# Altium footprint library 排针排座.PcbLib: 344 footprints (part 2 of 22)
Each footprint in its own frame and in the unit in brackets; x right, y up, seen from the top. Pads: shape width x height; smd on the part's side, far side on the other; paste and mask are expansions set on the pad; w line width, h text height; cw(c..) or ccw(c..) is an arc to the next point about the centre after c.
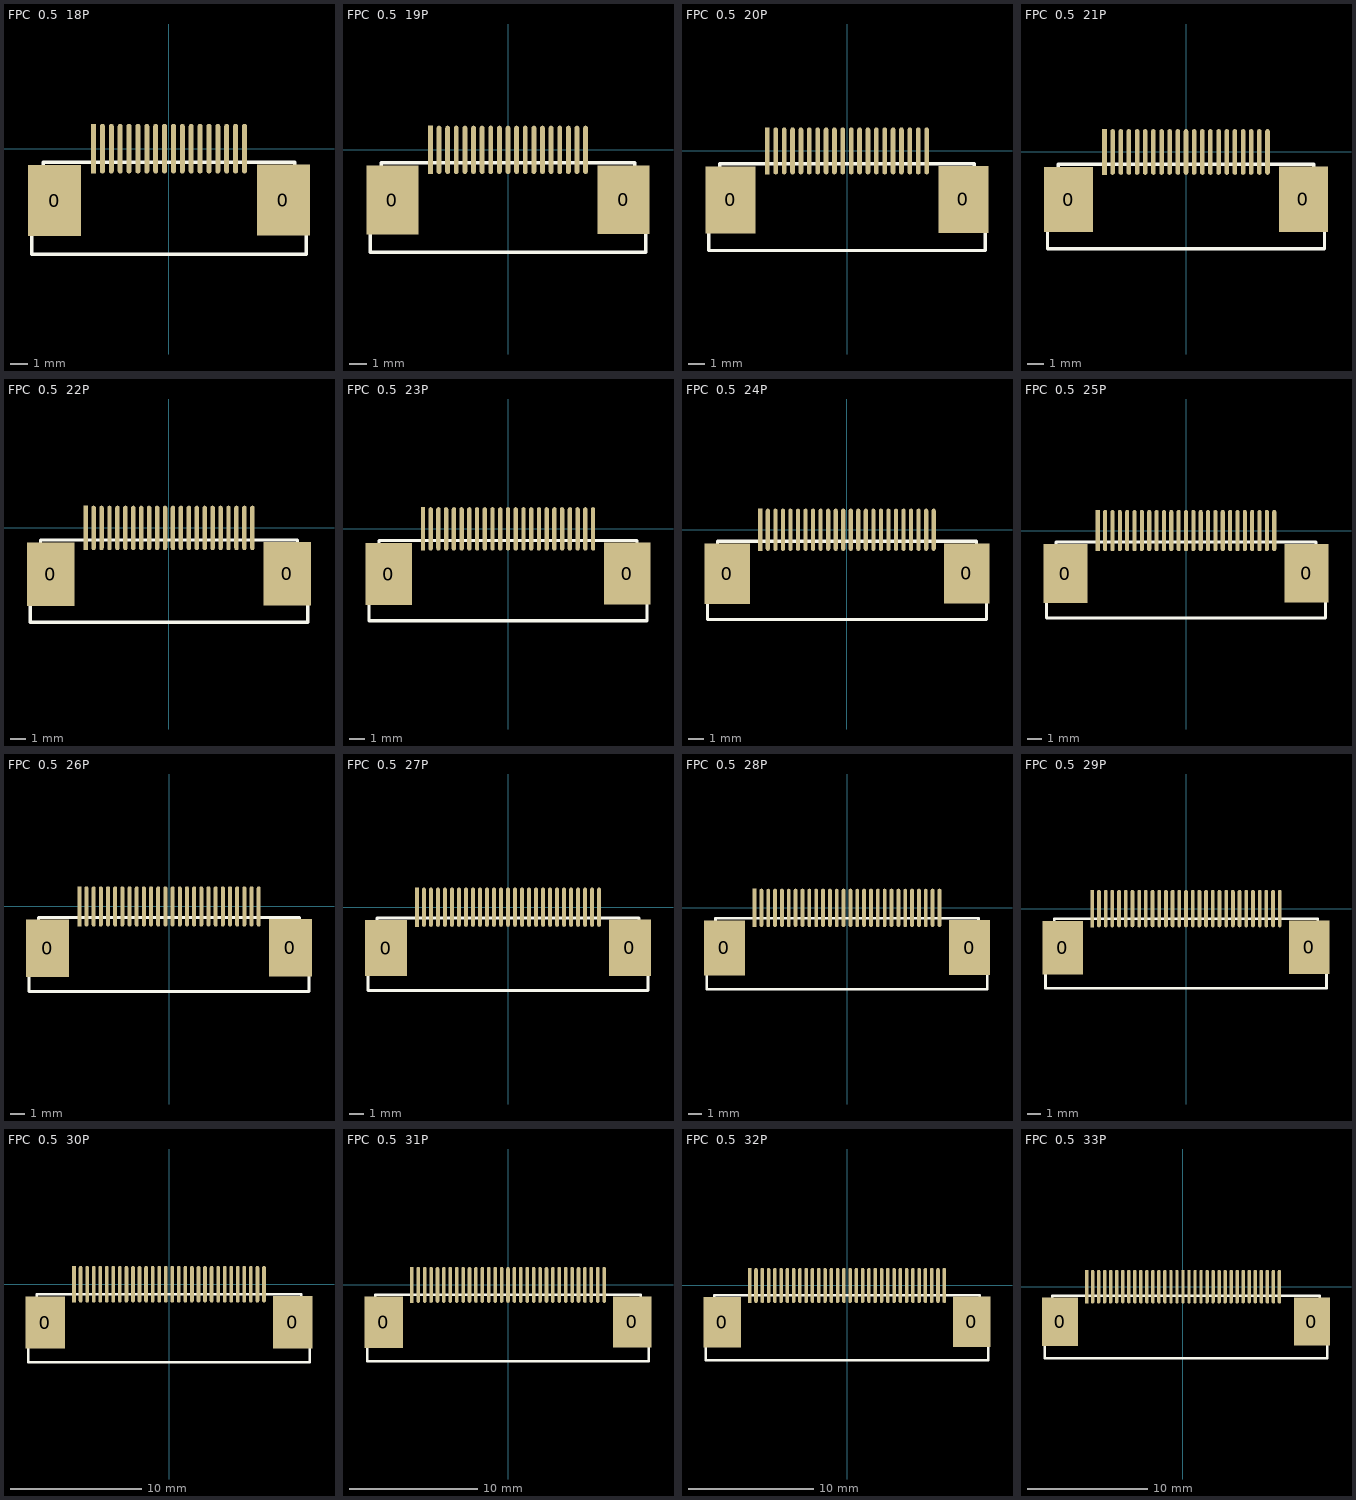
[diagram p1: the footprints below, top view; thin cyan lines are the x and y axes]

## FPC  0.5  18P [mm]
height 2
pads (20):
  rect 3x4 smd: 0(-6.446,-2.921) 0(6.454,-2.896)
  rect 0.28x2.8 smd: 1(-4.246,0)
  oval 0.28x2.8 smd: 2(-3.746,0) 3(-3.246,0) 4(-2.746,0) 5(-2.246,0) 6(-1.746,0) 7(-1.246,0) 8(-0.746,0) 9(-0.246,0) 10(0.254,0) 11(0.754,0) 12(1.254,0) 13(1.754,0) 14(2.254,0) 15(2.754,0) 16(3.254,0) 17(3.754,0) 18(4.254,0)
Top Overlay:
  lines w0.203: -7.738,-5.944 -7.738,-4.624 -7.14,-4.624 -7.088,-4.572 -7.088,-0.762 7.096,-0.762 7.096,-4.572 7.148,-4.624 7.746,-4.624 7.746,-5.944 -7.738,-5.944
3D body "FPC  0.5  18P.step": height 2, standoff 0, extent -7.65,-6 7.65,0

## FPC  0.5  19P [mm]
height 2
pads (21):
  rect 3x4 smd: 0(-6.7,-2.921) 0(6.7,-2.896)
  rect 0.28x2.8 smd: 1(-4.5,0)
  oval 0.28x2.8 smd: 2(-4,0) 3(-3.5,0) 4(-3,0) 5(-2.5,0) 6(-2,0) 7(-1.5,0) 8(-1,0) 9(-0.5,0) 10(0,0) 11(0.5,0) 12(1,0) 13(1.5,0) 14(2,0) 15(2.5,0) 16(3,0) 17(3.5,0) 18(4,0) 19(4.5,0)
Top Overlay:
  lines w0.203: -7.992,-5.944 -7.992,-4.624 -7.394,-4.624 -7.342,-4.572 -7.342,-0.762 7.342,-0.762 7.342,-4.572 7.394,-4.624 7.992,-4.624 7.992,-5.944 -7.992,-5.944
3D body "FPC  0.5  19P.step": height 2, standoff 0, extent -7.9,-6 7.9,0

## FPC  0.5  20P [mm]
height 2
pads (22):
  rect 3x4 smd: 0(-6.955,-2.921) 0(6.945,-2.896)
  rect 0.28x2.8 smd: 1(-4.755,0)
  oval 0.28x2.8 smd: 2(-4.255,0) 3(-3.755,0) 4(-3.255,0) 5(-2.755,0) 6(-2.255,0) 7(-1.755,0) 8(-1.255,0) 9(-0.755,0) 10(-0.255,0) 11(0.245,0) 12(0.745,0) 13(1.245,0) 14(1.745,0) 15(2.245,0) 16(2.745,0) 17(3.245,0) 18(3.745,0) 19(4.245,0) 20(4.745,0)
Top Overlay:
  lines w0.203: -8.247,-5.944 8.236,-5.944 8.236,-4.624 7.638,-4.624 7.586,-4.572 7.586,-0.762 -7.597,-0.762 -7.597,-4.572 -7.649,-4.624 -8.247,-4.624 -8.247,-5.944
3D body "FPC  0.5  20P.step": height 2, standoff 0, extent -8.15,-6 8.15,0

## FPC  0.5  21P [mm]
height 2
pads (23):
  rect 3x4 smd: 0(-7.2,-2.921) 0(7.2,-2.896)
  rect 0.28x2.8 smd: 1(-5,0)
  oval 0.28x2.8 smd: 2(-4.5,0) 3(-4,0) 4(-3.5,0) 5(-3,0) 6(-2.5,0) 7(-2,0) 8(-1.5,0) 9(-1,0) 10(-0.5,0) 11(0,0) 12(0.5,0) 13(1,0) 14(1.5,0) 15(2,0) 16(2.5,0) 17(3,0) 18(3.5,0) 19(4,0) 20(4.5,0) 21(5,0)
Top Overlay:
  lines w0.203: -8.492,-5.944 -8.492,-4.624 -7.894,-4.624 -7.842,-4.572 -7.842,-0.762 7.842,-0.762 7.842,-4.572 7.894,-4.624 8.492,-4.624 8.492,-5.944 -8.492,-5.944
3D body "FPC  0.5  21P.step": height 2, standoff 0, extent -8.4,-6 8.4,0

## FPC  0.5  22P [mm]
height 2
pads (24):
  rect 3x4 smd: 0(-7.438,-2.921) 0(7.462,-2.896)
  rect 0.28x2.8 smd: 1(-5.238,0)
  oval 0.28x2.8 smd: 2(-4.738,0) 3(-4.238,0) 4(-3.738,0) 5(-3.238,0) 6(-2.738,0) 7(-2.238,0) 8(-1.738,0) 9(-1.238,0) 10(-0.738,0) 11(-0.238,0) 12(0.262,0) 13(0.762,0) 14(1.262,0) 15(1.762,0) 16(2.262,0) 17(2.762,0) 18(3.262,0) 19(3.762,0) 20(4.262,0) 21(4.762,0) 22(5.262,0)
Top Overlay:
  lines w0.203: -8.73,-5.944 -8.73,-4.624 -8.132,-4.624 -8.08,-4.572 -8.08,-0.762 8.104,-0.762 8.104,-4.572 8.156,-4.624 8.754,-4.624 8.754,-5.944 -8.73,-5.944
3D body "FPC  0.5  22P.step": height 2, standoff 0, extent -8.65,-6 8.65,0

## FPC  0.5  23P [mm]
height 2
pads (25):
  rect 3x4 smd: 0(-7.7,-2.921) 0(7.7,-2.896)
  rect 0.28x2.8 smd: 1(-5.5,0)
  oval 0.28x2.8 smd: 2(-5,0) 3(-4.5,0) 4(-4,0) 5(-3.5,0) 6(-3,0) 7(-2.5,0) 8(-2,0) 9(-1.5,0) 10(-1,0) 11(-0.5,0) 12(0,0) 13(0.5,0) 14(1,0) 15(1.5,0) 16(2,0) 17(2.5,0) 18(3,0) 19(3.5,0) 20(4,0) 21(4.5,0) 22(5,0) 23(5.5,0)
Top Overlay:
  lines w0.203: -8.992,-5.944 8.992,-5.944 8.992,-4.624 8.394,-4.624 8.342,-4.572 8.342,-0.762 -8.342,-0.762 -8.342,-4.572 -8.394,-4.624 -8.992,-4.624 -8.992,-5.944
3D body "FPC  0.5  23P.step": height 2, standoff 0, extent -8.9,-6 8.9,0

## FPC  0.5  24P [mm]
height 2
pads (26):
  rect 3x4 smd: 0(-7.946,-2.921) 0(7.954,-2.896)
  rect 0.28x2.8 smd: 1(-5.746,0)
  oval 0.28x2.8 smd: 2(-5.246,0) 3(-4.746,0) 4(-4.246,0) 5(-3.746,0) 6(-3.246,0) 7(-2.746,0) 8(-2.246,0) 9(-1.746,0) 10(-1.246,0) 11(-0.746,0) 12(-0.246,0) 13(0.254,0) 14(0.754,0) 15(1.254,0) 16(1.754,0) 17(2.254,0) 18(2.754,0) 19(3.254,0) 20(3.754,0) 21(4.254,0) 22(4.754,0) 23(5.254,0) 24(5.754,0)
Top Overlay:
  lines w0.203: -9.238,-5.944 -9.238,-4.624 -8.64,-4.624 -8.588,-4.572 -8.588,-0.762 8.596,-0.762 8.596,-4.572 8.648,-4.624 9.246,-4.624 9.246,-5.944 -9.238,-5.944
3D body "FPC  0.5  24P.step": height 2, standoff 0, extent -9.15,-6 9.15,0

## FPC  0.5  25P [mm]
height 2
pads (27):
  rect 3x4 smd: 0(-8.2,-2.921) 0(8.2,-2.896)
  rect 0.28x2.8 smd: 1(-6,0)
  oval 0.28x2.8 smd: 2(-5.5,0) 3(-5,0) 4(-4.5,0) 5(-4,0) 6(-3.5,0) 7(-3,0) 8(-2.5,0) 9(-2,0) 10(-1.5,0) 11(-1,0) 12(-0.5,0) 13(0,0) 14(0.5,0) 15(1,0) 16(1.5,0) 17(2,0) 18(2.5,0) 19(3,0) 20(3.5,0) 21(4,0) 22(4.5,0) 23(5,0) 24(5.5,0) 25(6,0)
Top Overlay:
  lines w0.203: -9.492,-5.944 -9.492,-4.624 -8.894,-4.624 -8.842,-4.572 -8.842,-0.762 8.842,-0.762 8.842,-4.572 8.894,-4.624 9.492,-4.624 9.492,-5.944 -9.492,-5.944
3D body "FPC  0.5  25P.step": height 2, standoff 0, extent -9.4,-6 9.4,0

## FPC  0.5  26P [mm]
height 2
pads (28):
  rect 3x4 smd: 0(-8.465,-2.921) 0(8.435,-2.896)
  rect 0.28x2.8 smd: 1(-6.265,0)
  oval 0.28x2.8 smd: 2(-5.765,0) 3(-5.265,0) 4(-4.765,0) 5(-4.265,0) 6(-3.765,0) 7(-3.265,0) 8(-2.765,0) 9(-2.265,0) 10(-1.765,0) 11(-1.265,0) 12(-0.765,0) 13(-0.265,0) 14(0.235,0) 15(0.735,0) 16(1.235,0) 17(1.735,0) 18(2.235,0) 19(2.735,0) 20(3.235,0) 21(3.735,0) 22(4.235,0) 23(4.735,0) 24(5.235,0) 25(5.735,0) 26(6.235,0)
Top Overlay:
  lines w0.203: -9.757,-5.944 -9.757,-4.624 -9.158,-4.624 -9.107,-4.572 -9.107,-0.762 9.077,-0.762 9.077,-4.572 9.129,-4.624 9.727,-4.624 9.727,-5.944 -9.757,-5.944
3D body "FPC  0.5  26P.step": height 2, standoff 0, extent -9.65,-6 9.65,0

## FPC  0.5  27P [mm]
height 2
pads (29):
  rect 3x4 smd: 0(-8.7,-2.921) 0(8.7,-2.896)
  rect 0.28x2.8 smd: 1(-6.5,0)
  oval 0.28x2.8 smd: 2(-6,0) 3(-5.5,0) 4(-5,0) 5(-4.5,0) 6(-4,0) 7(-3.5,0) 8(-3,0) 9(-2.5,0) 10(-2,0) 11(-1.5,0) 12(-1,0) 13(-0.5,0) 14(0,0) 15(0.5,0) 16(1,0) 17(1.5,0) 18(2,0) 19(2.5,0) 20(3,0) 21(3.5,0) 22(4,0) 23(4.5,0) 24(5,0) 25(5.5,0) 26(6,0) 27(6.5,0)
Top Overlay:
  lines w0.203: -9.992,-5.944 9.992,-5.944 9.992,-4.624 9.394,-4.624 9.342,-4.572 9.342,-0.762 -9.342,-0.762 -9.342,-4.572 -9.394,-4.624 -9.992,-4.624 -9.992,-5.944
3D body "FPC  0.5  27P.step": height 2, standoff 0, extent -9.9,-6 9.9,0

## FPC  0.5  28P [mm]
height 2
pads (30):
  rect 3x4 smd: 0(-8.954,-2.921) 0(8.946,-2.896)
  rect 0.28x2.8 smd: 1(-6.754,0)
  oval 0.28x2.8 smd: 2(-6.254,0) 3(-5.754,0) 4(-5.254,0) 5(-4.754,0) 6(-4.254,0) 7(-3.754,0) 8(-3.254,0) 9(-2.754,0) 10(-2.254,0) 11(-1.754,0) 12(-1.254,0) 13(-0.754,0) 14(-0.254,0) 15(0.246,0) 16(0.746,0) 17(1.246,0) 18(1.746,0) 19(2.246,0) 20(2.746,0) 21(3.246,0) 22(3.746,0) 23(4.246,0) 24(4.746,0) 25(5.246,0) 26(5.746,0) 27(6.246,0) 28(6.746,0)
Top Overlay:
  lines w0.203: -10.246,-5.944 -10.246,-4.624 -9.648,-4.624 -9.596,-4.572 -9.596,-0.762 9.588,-0.762 9.588,-4.572 9.64,-4.624 10.238,-4.624 10.238,-5.944 -10.246,-5.944
3D body "FPC  0.5  28P.step": height 2, standoff 0, extent -10.15,-6 10.15,0

## FPC  0.5  29P [mm]
height 2
pads (31):
  rect 3x4 smd: 0(-9.2,-2.921) 0(9.2,-2.896)
  rect 0.28x2.8 smd: 1(-7,0)
  oval 0.28x2.8 smd: 2(-6.5,0) 3(-6,0) 4(-5.5,0) 5(-5,0) 6(-4.5,0) 7(-4,0) 8(-3.5,0) 9(-3,0) 10(-2.5,0) 11(-2,0) 12(-1.5,0) 13(-1,0) 14(-0.5,0) 15(0,0) 16(0.5,0) 17(1,0) 18(1.5,0) 19(2,0) 20(2.5,0) 21(3,0) 22(3.5,0) 23(4,0) 24(4.5,0) 25(5,0) 26(5.5,0) 27(6,0) 28(6.5,0) 29(7,0)
Top Overlay:
  lines w0.203: -10.492,-5.944 10.492,-5.944 10.492,-4.624 9.894,-4.624 9.842,-4.572 9.842,-0.762 -9.842,-0.762 -9.842,-4.572 -9.894,-4.624 -10.492,-4.624 -10.492,-5.944
3D body "FPC  0.5  29P.step": height 2, standoff 0, extent -10.4,-6 10.4,0

## FPC  0.5  30P [mm]
height 2
pads (32):
  rect 3x4 smd: 0(-9.455,-2.921) 0(9.445,-2.896)
  rect 0.28x2.8 smd: 1(-7.255,0)
  oval 0.28x2.8 smd: 2(-6.755,0) 3(-6.255,0) 4(-5.755,0) 5(-5.255,0) 6(-4.755,0) 7(-4.255,0) 8(-3.755,0) 9(-3.255,0) 10(-2.755,0) 11(-2.255,0) 12(-1.755,0) 13(-1.255,0) 14(-0.755,0) 15(-0.255,0) 16(0.245,0) 17(0.745,0) 18(1.245,0) 19(1.745,0) 20(2.245,0) 21(2.745,0) 22(3.245,0) 23(3.745,0) 24(4.245,0) 25(4.745,0) 26(5.245,0) 27(5.745,0) 28(6.245,0) 29(6.745,0) 30(7.245,0)
Top Overlay:
  lines w0.203: -10.747,-5.944 10.736,-5.944 10.736,-4.624 10.138,-4.624 10.086,-4.572 10.086,-0.762 -10.097,-0.762 -10.097,-4.572 -10.149,-4.624 -10.747,-4.624 -10.747,-5.944
3D body "FPC  0.5  30P.step": height 2, standoff 0, extent -10.65,-6 10.65,0

## FPC  0.5  31P [mm]
height 2
pads (33):
  rect 3x4 smd: 0(-9.7,-2.921) 0(9.7,-2.896)
  rect 0.28x2.8 smd: 1(-7.5,0)
  oval 0.28x2.8 smd: 2(-7,0) 3(-6.5,0) 4(-6,0) 5(-5.5,0) 6(-5,0) 7(-4.5,0) 8(-4,0) 9(-3.5,0) 10(-3,0) 11(-2.5,0) 12(-2,0) 13(-1.5,0) 14(-1,0) 15(-0.5,0) 16(0,0) 17(0.5,0) 18(1,0) 19(1.5,0) 20(2,0) 21(2.5,0) 22(3,0) 23(3.5,0) 24(4,0) 25(4.5,0) 26(5,0) 27(5.5,0) 28(6,0) 29(6.5,0) 30(7,0) 31(7.5,0)
Top Overlay:
  lines w0.203: -10.992,-5.944 -10.992,-4.624 -10.394,-4.624 -10.342,-4.572 -10.342,-0.762 10.342,-0.762 10.342,-4.572 10.394,-4.624 10.992,-4.624 10.992,-5.944 -10.992,-5.944
3D body "FPC  0.5  31P.step": height 2, standoff 0, extent -10.9,-6 10.9,0

## FPC  0.5  32P [mm]
height 2
pads (34):
  rect 3x4 smd: 0(-9.963,-2.921) 0(9.937,-2.896)
  rect 0.28x2.8 smd: 1(-7.763,0)
  oval 0.28x2.8 smd: 2(-7.263,0) 3(-6.763,0) 4(-6.263,0) 5(-5.763,0) 6(-5.263,0) 7(-4.763,0) 8(-4.263,0) 9(-3.763,0) 10(-3.263,0) 11(-2.763,0) 12(-2.263,0) 13(-1.763,0) 14(-1.263,0) 15(-0.763,0) 16(-0.263,0) 17(0.237,0) 18(0.737,0) 19(1.237,0) 20(1.737,0) 21(2.237,0) 22(2.737,0) 23(3.237,0) 24(3.737,0) 25(4.237,0) 26(4.737,0) 27(5.237,0) 28(5.737,0) 29(6.237,0) 30(6.737,0) 31(7.237,0) 32(7.737,0)
Top Overlay:
  lines w0.203: -11.255,-5.944 11.228,-5.944 11.228,-4.624 10.63,-4.624 10.578,-4.572 10.578,-0.762 -10.605,-0.762 -10.605,-4.572 -10.657,-4.624 -11.255,-4.624 -11.255,-5.944
3D body "FPC  0.5  32P.step": height 2, standoff 0, extent -11.15,-6 11.15,0

## FPC  0.5  33P [mm]
height 2
pads (35):
  rect 3x4 smd: 0(-10.2,-2.921) 0(10.7,-2.896)
  rect 0.28x2.8 smd: 1(-8,0)
  oval 0.28x2.8 smd: 2(-7.5,0) 3(-7,0) 4(-6.5,0) 5(-6,0) 6(-5.5,0) 7(-5,0) 8(-4.5,0) 9(-4,0) 10(-3.5,0) 11(-3,0) 12(-2.5,0) 13(-2,0) 14(-1.5,0) 15(-1,0) 16(-0.5,0) 17(0,0) 18(0.5,0) 19(1,0) 20(1.5,0) 21(2,0) 22(2.5,0) 23(3,0) 24(3.5,0) 25(4,0) 26(4.5,0) 27(5,0) 28(5.5,0) 29(6,0) 30(6.5,0) 31(7,0) 32(7.5,0) 33(8,0)
Top Overlay:
  lines w0.203: -11.492,-5.944 11.992,-5.944 11.992,-4.624 11.394,-4.624 11.342,-4.572 11.342,-0.762 -10.842,-0.762 -10.842,-4.572 -10.894,-4.624 -11.492,-4.624 -11.492,-5.944
3D body "FPC  0.5  33P.step": height 2, standoff 0, extent -11.4,-6 11.4,0